# Altium footprint library PCBLIB.PcbLib: 557 footprints (part 12 of 36)
Each footprint in its own frame and in the unit in brackets; x right, y up, seen from the top. Pads: shape width x height; smd on the part's side, far side on the other; paste and mask are expansions set on the pad; w line width, h text height; cw(c..) or ccw(c..) is an arc to the next point about the centre after c.
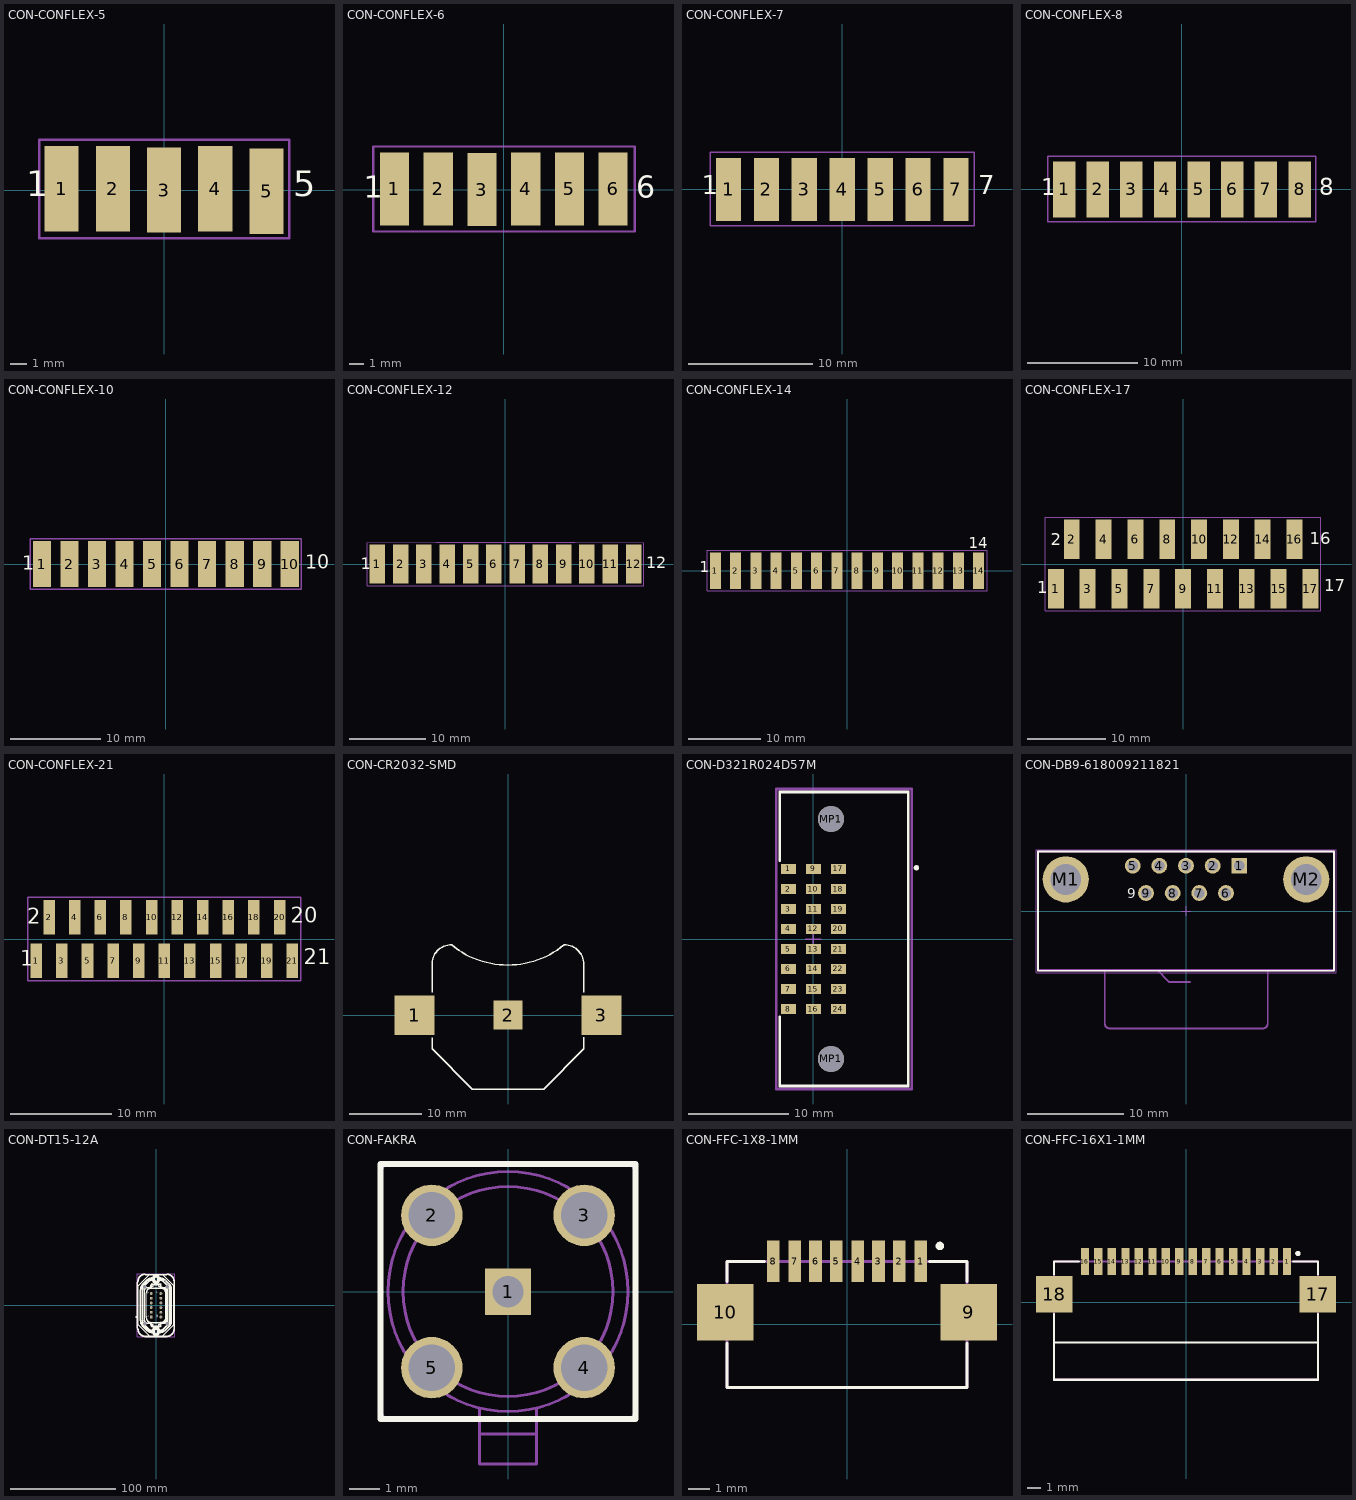
[diagram p11: the footprints below, top view; thin cyan lines are the x and y axes]

## CON-CONFLEX-5 [mil]
pads (5):
  rect 80x200 smd: 1(-240,3) 2(-120,3) 3(0,0) 4(120,3) 5(240,-3)
Top Overlay:
  text "1" at -323,-15 h60
  text "5" at 303,-15 h60
ASM Top:
  lines w6: -293,-113 -293,118 293,118 293,-113 -293,-113

## CON-CONFLEX-6 [mil]
pads (6):
  rect 80x200 smd: 1(-300,2) 2(-180,2) 3(-60,0) 4(60,2) 5(180,2) 6(300,2)
Top Overlay:
  text "6" at 363,-23 h60
  text "1" at -384,-23 h60
ASM Top:
  lines w6: -358,-115 359,-115 359,118 -358,118 -358,-115

## CON-CONFLEX-7 [mil]
pads (7):
  rect 80x200 smd: 1(-360,0) 2(-240,0) 3(-120,0) 4(0,0) 5(120,0) 6(240,0) 7(360,0)
Top Overlay:
  text "7" at 430,-15 h60
  text "1" at -445,-15 h60
ASM Top:
  lines w6: -418,-115 -418,118 418,118 418,-115 -418,-115

## CON-CONFLEX-8 [mil]
pads (8):
  rect 80x200 smd: 1(-420,0) 2(-300,0) 3(-180,0) 4(-60,0) 5(60,0) 6(180,0) 7(300,0) 8(420,0)
Top Overlay:
  text "1" at -501,-20 h60
  text "8" at 490,-20 h60
ASM Top:
  lines w6: -478,-115 -478,118 478,118 478,-115 -478,-115

## CON-CONFLEX-10 [mil]
pads (10):
  rect 80x200 smd mask+4: 1(-540,0) 2(-420,0) 3(-300,0) 4(-180,0) 5(-60,0) 6(60,0) 7(180,0) 8(300,0) 9(420,0) 10(540,0)
Top Overlay:
  text "10" at 608,-21 h60
  text "1" at -625,-25 h60
ASM Top:
  lines w6: -590,-110 590,-110 590,110 -590,110 -590,-110
  text ".designator" at -23.62,0 h31.5

## CON-CONFLEX-12 [mil]
pads (12):
  rect 80x200 smd mask+4: 1(-660,0) 2(-540,0) 3(-420,0) 4(-300,0) 5(-180,0) 6(-60,0) 7(60,0) 8(180,0) 9(300,0) 10(420,0) 11(540,0) 12(660,0)
Top Overlay:
  text "12" at 726,-23 h60
  text "1" at -746,-28 h60
ASM Top:
  lines w6: -713,-113 -713,110 -355.5,113 357.5,113 713,110 713,-113 -713,-113

## CON-CONFLEX-14 [mil]
pads (14):
  rect 60x200 smd mask+4: 1(-715,0) 2(-605,0) 3(-495,0) 4(-385,0) 5(-275,0) 6(-165,0) 7(-55,0) 8(55,0) 9(165,0) 10(275,0) 11(385,0) 12(495,0) 13(605,0) 14(715,0)
Top Overlay:
  text "1" at -801,-8 h60
  text "14" at 662,123 h60
ASM Top:
  lines w6: -760,-110 763,-110 763,110 -760,110 -760,-110

## CON-CONFLEX-17 [mil]
pads (17):
  rect 80x200 smd mask+4: 1(-640,-125) 2(-560,125) 3(-480,-125) 4(-400,125) 5(-320,-125) 6(-240,125) 7(-160,-125) 8(-80,125) 9(0,-125) 10(80,125) 11(160,-125) 12(240,125) 13(320,-125) 14(400,125) 15(480,-125) 16(560,125) 17(640,-125)
Top Overlay:
  text "17" at 709,-138 h60
  text "16" at 637,99 h60
  text "2" at -667,95 h60
  text "1" at -734,-148 h60
ASM Top:
  lines w6: -693,-235 693,-235 693,235 -693,235 -693,-235

## CON-CONFLEX-21 [mil]
pads (21):
  rect 45x135 smd: 1(-500,-85) 2(-450,85) 3(-400,-85) 4(-350,85) 5(-300,-85) 6(-250,85) 7(-200,-85) 8(-150,85) 9(-100,-85) 10(-50,85) 11(0,-85) 12(50,85) 13(100,-85) 14(150,85) 15(200,-85) 16(250,85) 17(300,-85) 18(350,85) 19(400,-85) 20(450,85) 21(500,-85)
Top Overlay:
  text "1" at -562,-105 h60
  text "2" at -535,60 h60
  text "20" at 493,63 h60
  text "21" at 544,-99 h60
ASM Top:
  lines w6: -533,-163 533,-163 533,163 -533,163 -533,-163

## CON-CR2032-SMD [mm] "COIN HOLDER"
pads (3):
  rect 5.5x5.5 smd: 1(-13,0) 3(13,0)
  rect 4x4 smd: 2(0,0)
Top Overlay:
  lines w0.2: -10.541,3.17 -10.541,7.272 -10.54,7.273 -10.54,7.255 ; -10.541,7.239 cw(c-7.925,7.162) -7.848,9.779 ccw(c-0.024,19.196) 7.8,9.779 cw(c7.822,7.06) 10.541,7.081 ; -10.54,-3.12 -10.541,-3.119 -10.541,-3.121 -10.541,-4.712 -4.978,-10.275 4.978,-10.275 10.541,-4.712 10.541,-3.101 ; 10.541,3.201 10.541,7.185
ASM Top:
  text ".designator" at -2,0.003 h0.8
3D body "User Library-3002.step": height 3.98, standoff 0.01, extent -15.367,-10.274 15.367,9.779

## CON-D321R024D57M [mm]
pads (26):
  rect 1.5x1 smd mask+0.05: 1(-2.5,7) 2(-2.5,5) 3(-2.5,3) 4(-2.5,1) 5(-2.5,-1) 6(-2.5,-3) 7(-2.5,-5) 8(-2.5,-7) 9(0,7) 10(0,5) 11(0,3) 12(0,1) 13(0,-1) 14(0,-3) 15(0,-5) 16(0,-7) 17(2.5,7) 18(2.5,5) 19(2.5,3) 20(2.5,1) 21(2.5,-1) 22(2.5,-3) 23(2.5,-5) 24(2.5,-7)
  round 2.6 hole 2.6 unplated: MP1(1.75,-12) MP1(1.75,12)
Top Overlay:
  circle w0.3: c10.3,7.125 r0.12
  lines w0.254: -3.375,-7.8 -3.375,-14.7 9.475,-14.7 9.475,14.7 -3.375,14.7 -3.375,7.85
Mechanical 15:
  lines w0.15: -0.8,0 0,0 ; 0,-0.8 0,0 ; 0,0.8 0,0 ; 0.8,0 0,0
  lines w0.254: -3.7,-15 9.85,-15 9.85,15 -3.7,15 -3.7,-15
3D body "D321R024D57M.STEP": height 8.6, standoff -6.55, extent -3.184,-14.5 9.29,14.5

## CON-DB9-618009211821 [mm] "09p 8.08mm bracket, board lock & UNC4-40 Rivet without hex screw"
height 12.5
pads (11):
  rect 1.65x1.65 hole 1.09: 1(5.54,4.72)
  round 1.65 hole 1.09: 2(2.77,4.72) 3(0,4.72) 4(-2.77,4.72) 5(-5.54,4.72) 6(4.155,1.88) 7(1.385,1.88) 8(-1.385,1.88) 9(-4.155,1.88)
  round 4.8 hole 3.2: M1(-12.5,3.3) M2(12.5,3.3)
Top Overlay:
  lines w0.2: -15.4,-6.2 -15.4,6.2 15.4,6.2 15.4,-6.2 -15.4,-6.2
  text "9" at -6.1,1.35 h1.02
Dimensions:
  lines w0.2: -15.4,-6.12 15.4,-6.12 ; -3,-6.12 -1.77,-7.35 0.4,-7.35
  text "PCB Edge" at 0.7,-8.05 h1.02
Mechanical 15:
  lines w0.05: -0.5,0 0.5,0 ; 0,-0.5 0,0.5 ; -15.6,-6.4 15.6,-6.4 15.6,6.4 -15.6,6.4 -15.6,-6.4
ASM Top:
  lines w0.2: -8.45,-6.2 -8.45,-11.7 ccw(c-7.95,-11.7) -7.95,-12.2 ; -8,-12.2 8,-12.2 ccw(c8,-11.7) 8.5,-11.7 8.5,-6.2 ; -15.4,-6.2 -15.4,6.2 15.4,6.2 15.4,-6.2 -15.4,-6.2
  text ".designator" at 0,0.115 h0.8
3D body "618009211821.stp": height 12.55, standoff -3.95, extent -15.4,-12.2 15.4,6.2

## CON-DT15-12A [mm] "12 Position 4.44mm"
height 3.12
pads (16):
  rect 2.7x2.7 hole 1.77: 1(-4.56,-11.115)
  round 2.7 hole 1.77: 2(-4.56,-6.67) 3(-4.56,-2.225) 4(-4.56,2.225) 5(-4.56,6.67) 6(-4.56,11.115) 7(4.56,11.115) 8(4.56,6.67) 9(4.56,2.225) 10(4.56,-2.225) 11(4.56,-6.67) 12(4.56,-11.115)
  round 3 hole 3 unplated: ""(-10.67,-17.545) ""(-10.67,17.535) ""(10.67,-17.545) ""(10.67,17.535)
Top Overlay:
  drawing of 420 lines, arcs and shapes, not listed
  text "7" at 2.7,11.2 h2
  text "6" at -6.6,11 h2
  text "1" at -6.5,-11.3 h2
  text "12" at 2.7,-11.6 h2
Mechanical 15:
  lines w0.2: -17.9,-29.9 -17.9,29.9 17.9,29.9 17.9,-29.9 -17.9,-29.9
ASM Top:
  lines w0.2: -17.627,-21.986 ccw(c-10.007,-21.986) -10.007,-29.606 10.008,-29.606 ccw(c10.008,-21.986) 17.628,-21.986 17.628,21.981 ccw(c10.008,21.981) 10.008,29.601 -10.007,29.601 ccw(c-10.007,21.981) -17.627,21.981 -17.627,-21.986
  text ".designator" at -1.5,-0.2 h0.8
3D body "c-dt15-12pa-e-3d.stp": height 30.14, standoff -3.09, extent -17.628,-29.604 17.628,29.604

## CON-FAKRA [mm] "Connector, HF, TH"
height 12.45
pads (5):
  rect 1.55x1.55 hole 1.05: 1(0,0)
  round 2.05 hole 1.55: 2(-2.54,2.54) 3(2.54,2.54) 4(2.54,-2.54) 5(-2.54,-2.54)
Top Overlay:
  lines w0.2: -4.25,-4.25 4.25,-4.25 4.25,4.25 -4.25,4.25 -4.25,-4.25
ASM Top:
  circle w0.1: c0,0 r3.5
  circle w0.1: c0,0 r4
  lines w0.1: -0.95,-4.25 -3.95,-4.25 cw(c-3.95,-3.95) -4.25,-3.95 -4.25,3.95 cw(c-3.95,3.95) -3.95,4.25 3.95,4.25 cw(c3.95,3.95) 4.25,3.95 4.25,-3.95 cw(c3.95,-3.95) 3.95,-4.25 0.95,-4.25 ; -0.95,-3.886 -0.95,-4.75 ; 0.95,-3.886 0.95,-4.75 ; -0.95,-4.75 0.95,-4.75 ; -0.95,-4.75 -0.95,-5.75 0.95,-5.75 0.95,-4.75
  text ".Designator" at -1.524,-0.508 h1.02
3D body "59S10H-40ML5-Z.stp": height 12.45, standoff -2, extent -4.25,-5.75 4.25,4.25

## CON-FFC-1X8-1MM [mil]
pads (10):
  rect 24x78 smd mask+2: 1(138,118) 2(98,118) 3(59,118) 4(20,118) 5(-20,118) 6(-59,118) 7(-98,118) 8(-138,118)
  rect 106x106 smd mask+2: 9(228,23) 10(-228,23)
Top Overlay:
  circle w7.87: c174,147 r3.94
  lines w6: -225,-35 -225,-118 225,-118 225,-35 ; -225,81 -225,118 -155,118 ; 155,118 225,118 225,81
ASM Top:
  lines w6: -225,-118 -225,118 225,118 225,-118 -225,-118
  text ".designator" at -209,-65 h31.5
3D body "8 way 1mm.stp": height 81.37, standoff -1.48, extent -248.1,-110 247.99,141.97

## CON-FFC-16X1-1MM [mil]
pads (18):
  rect 24x78 smd mask+2: 1(295,118) 2(256,118) 3(217,118) 4(177,118) 5(138,118) 6(98,118) 7(59,118) 8(20,118) 9(-20,118) 10(-59,118) 11(-98,118) 12(-138,118) 13(-177,118) 14(-217,118) 15(-256,118) 16(-295,118)
  rect 106x106 smd mask+2: 17(385,23) 18(-385,23)
Top Overlay:
  circle w7.87: c326.77,141.73 r3.94
  lines w6: -385,-118 385,-118 ; -385,-35 -385,-227 385,-227 385,-35 ; -385,81 -385,118 -312,118 ; 312,118 385,118 385,81
ASM Top:
  lines w6: -385,-227 -385,118 385,118 385,-227 -385,-227
  text ".designator" at -295,-27 h31.5
3D body "16 way 1mm.stp": height 81.48, standoff -1.48, extent -406.06,-115 405,136.97